# Altium integrated library Supernova Connectors.IntLib: 270 symbols (part 1 of 2) (continued)
## M80-4001442 (continued)

## M80-4131498
designator J?
Housing M80 14POS Screw-lock; Value: 14 Power Pins; Package / Case: THT, RA; Operating Temperature: -55°C ~ 85°C; Supplier 1: Mouser; Supplier 2: Digi-Key; Supplier Part Number 1: 855-M80-4131498; Supplier Part Number 2: 952-3702-ND
pins: 1, 2, 3, 4, 5, 6, 7, 8, 9, 10, 11, 12, 13, 14

## M80-4140898
designator J?
Housing M80 8POS Screw-lock; Value: 14 Power Pins; Package / Case: THT, RA; Operating Temperature: -55°C ~ 85°C; Supplier 1: Mouser; Supplier 2: Digi-Key; Supplier Part Number 2: 952-3732-ND; Supplier Part Number 1: 855-M80-4140898
pins: 1, 2, 3, 4, 5 8, 6, 7, 8

## M80-4141698
designator J?
Housing M80 16POS Screw-lock; Value: 14 Power Pins; Package / Case: THT, RA; Operating Temperature: -55°C ~ 85°C; Supplier 1: Digi-Key; Supplier Part Number 1: 952-3736-ND; Supplier 2: Mouser; Supplier Part Number 2: 855-M80-4141698
pins: 1, 2, 3, 4, 5, 6, 7, 8, 9, 10, 11, 12, 13, 14, 15, 16

## M80-5000000M2-02-331-00-000
designator J?
Header M80 2POS Power Screw-lock; Manufacturer: Harwin; System: Connector; Operating Temperature: -55°C ~ 85°C; Supplier 1: Digi-Key; Supplier Part Number 1: 952-2577-ND; Supplier 2: Mouser; Supplier Part Number 2: 855-M805M202331
footprint M80-5000000M2-02-331-00-000
footprint M80-5000000M2-02-331-00-000 - No Silk
footprint M80-5000000M2-02-331-00-000 - No Silk - nuts
footprint M80-5000000M2-02-331-00-000 - nuts
pins: A, B, F1 F, F2 F

## M80-5000000M2-04-331-00-000
designator J?
Header M80 4POS Power Screw-lock; System: Connector; Supplier 1: Mouser; Supplier Part Number 1: 855-M80500000M204331; Supplier 2: Digi-Key; Supplier Part Number 2: 952-1652-ND
footprint M80-5000000M2-04-331-00-000 - no silk
footprint M80-5000000M2-04-331-00-000
footprint M80-5000000M2-04-331-00-000 - no silk - nuts
pins: A, B, C, D, F1 F, F2 F

## M80-5000000M5-02-333-00-000
designator J?
Header M80 2POS Power RA Screw-lock; Manufacturer: Harwin; Manufacturer Part Number: M80-5401442; Value: 14 Power Pins; System: Connector; Package / Case: THT, RA; Operating Temperature: -55°C ~ 85°C; Supplier 1: Digi-Key; Supplier Part Number 1: 952-2578-ND; Supplier 2: Mouser; Supplier Part Number 2: 855-M805000M50233300
footprint M80-5000000M5-02-333-00-000
footprint M80-5000000M5-02-333-00-000 - button screws
pins: 1, 2, F1 F, F2 F

## M80-5000000M5-04-333-00-000
designator J?
Header M80 4POS Power RA Screw-lock; System: Connector; Supplier 1: Digi-Key; Supplier Part Number 1: 952-3955-5-ND; Supplier 2: Mouser; Supplier Part Number 2: 855-M805000000M50433
footprint M80-5000000M5-04-333-00-000
pins: 1, 2, 3, 4, F1 F, F2 F

## M80-5000442
designator J?
Header M80 4POS Vertical Screw-lock no studs; Manufacturer: Harwin; Manufacturer Part Number: M80-5101442; Value: 14 Power Pins; System: Connector; Package / Case: THT, RA; Operating Temperature: -55°C ~ 85°C; Supplier 1: Mouser; Supplier Part Number 1: 855-M80-5100442; Supplier 2: Digi-Key; Supplier Part Number 2: 952-2343-ND
footprint M80-5000442
footprint M80-5000442 - no holes
pins: 1, 2, 3, 4, F

## M80-5000642
designator J?
Header M80 6POS Vertical Screw-lock no studs; Manufacturer: Harwin; Manufacturer Part Number: M80-5101442; Value: 14 Power Pins; System: Connector; Package / Case: THT, RA; Operating Temperature: -55°C ~ 85°C; Supplier 1: Mouser; Supplier Part Number 1: 855-M80-5000642; Supplier 2: Digi-Key; Supplier Part Number 2: 952-1000-5-ND
footprint M80-5000642
footprint M80-5000642 - no holes
pins: 1, 2, 3, 4, 5, 6, F

## M80-5100442
designator J?
Header M80 4POS Vertical Screw-lock; Manufacturer: Harwin; Manufacturer Part Number: M80-5101442; Value: 14 Power Pins; System: Connector; Package / Case: THT, RA; Operating Temperature: -55°C ~ 85°C; Supplier 1: Digi-Key; Supplier Part Number 1: 952-2343-ND; Supplier 2: Mouser; Supplier Part Number 2: 855-M80-5100442
footprint M80-5100442
pins: 1, 2, 3, 4, F

## M80-5100642
designator J?
Header M80 6POS Vertical Screw-lock; Manufacturer: Harwin; Manufacturer Part Number: M80-5101442; Value: 14 Power Pins; System: Connector; Package / Case: THT, RA; Operating Temperature: -55°C ~ 85°C; Supplier 1: Digi-Key; Supplier Part Number 1: 952-3550-ND; Supplier 2: Newark; Supplier Part Number 2: 45AJ6518
footprint M80-5100642
pins: 1, 2, 3, 4, 5, 6, F

## M80-5100842
designator J?
Header M80 8POS Vertical Screw-lock; Manufacturer: Harwin; Manufacturer Part Number: M80-5101442; Value: 14 Power Pins; System: Connector; Package / Case: THT, RA; Operating Temperature: -55°C ~ 85°C; Supplier 1: Digi-Key; Supplier Part Number 1: 952-2341-ND; Supplier 2: Mouser; Supplier Part Number 2: 855-M80-5100842
footprint M80-5100842
pins: 1, 2, 3, 4, 5, 6, 7, 8, F

## M80-5101042
designator J?
Header M80 10POS Vertical Screw-lock; Manufacturer: Harwin; Manufacturer Part Number: M80-5101442; Value: 14 Power Pins; System: Connector; Package / Case: THT, RA; Operating Temperature: -55°C ~ 85°C; Supplier 1: Digi-Key; Supplier 2: Mouser; Supplier 3: Mouser; Supplier 4: Digi-Key; Supplier Part Number 1: 952-1009-5-ND; Supplier Part Number 4: 952-2914-ND; Supplier Part Number 2: 855-M80-5101042; Supplier Part Number 3: 855-M80-5101022
footprint M80-5101042
footprint M80-5101042 - NO SILK
footprint M80-5101042 - NO SILK - NUTS
pins: 1, 2, 3, 4, 5, 6, 7, 8, 9, 10, F

## M80-5101242
designator J?
Header M80 12POS Vertical Screw-lock; Manufacturer: Harwin; Manufacturer Part Number: M80-5101442; Value: 14 Power Pins; System: Connector; Package / Case: THT, RA; Operating Temperature: -55°C ~ 85°C; Supplier 1: Digi-Key; Supplier Part Number 1: 952-2580-ND; Supplier 2: Mouser; Supplier Part Number 2: 855-M80-5101242
footprint M80-5101242
pins: 1, 2, 3, 4, 5, 6, 7, 8, 9, 10, 11, 12, F

## M80-5101442
designator J?
Header M80 14POS Vertical Screw-lock; Manufacturer: Harwin; Value: 14 Power Pins; System: Connector; Mass_g: 2.198; Manufacturer Part Number: M80-5101442; Package / Case: THT, RA; Operating Temperature: -55°C ~ 85°C; Supplier 1: Digi-Key; Supplier Part Number 1: 952-1010-5-ND; Supplier 2: Mouser; Supplier 3: Newark; Supplier 4: Mouser; Supplier Part Number 2: 855-M80-5101442; Supplier Part Number 3: 92K7305; Supplier Part Number 4: 855-M80-5101405
footprint M80-5101442
pins: 1, 2, 3, 4, 5, 6, 7, 8, 9, 10, 11, 12, 13, 14, F

## M80-5400442
designator J?
Header M80 4POS RA Screw-lock; Manufacturer: Harwin; Manufacturer Part Number: M80-5401442; Value: 8 Power Pins; System: Connector; Package / Case: THT, RA; Operating Temperature: -55°C ~ 85°C; Supplier 1: Digi-Key; Supplier Part Number 1: 952-2583-ND; Supplier 2: Mouser; Supplier Part Number 2: 855-M80-5400442
footprint M80-5400442 (4 pin Datamate connector Male Horizontal PC Tail)
pins: 1, 2, 3, 4, F

## M80-5400842
designator J?
Header M80 8POS RA Screw-lock; Manufacturer: Harwin; Manufacturer Part Number: M80-5401442; Value: 8 Power Pins; System: Connector; Package / Case: THT, RA; Operating Temperature: -55°C ~ 85°C; Supplier 1: Digi-Key; Supplier Part Number 1: 952-2584-ND; Supplier 2: Mouser; Supplier 3: Mouser; Supplier Part Number 2: 855-M80-5400842; Supplier Part Number 3: 855-M80-5400805
footprint M80-5400842 (8 pin Datamate connector Male Horizontal PC Tail)
pins: 1, 2, 3, 4, 5, 6, 7, 8, F

## M80-5401442
designator J?
Header M80 14POS RA Screw-lock; Manufacturer: Harwin; Value: 14 Power Pins; System: Connector; Mass_g: 2.198; Manufacturer Part Number: M80-5401442; Supplier 1: Digi-Key; Supplier Part Number 1: 952-1026-5-ND; Package / Case: THT, RA; Operating Temperature: -55°C ~ 85°C; Supplier 2: Mouser; Supplier 3: Newark; Supplier Part Number 2: 855-M80-5401442; Supplier Part Number 3: 92K7321
footprint M80-5401442 (14 pin Datamate connector Male Horizontal PC Tail)
footprint M80-5401442 - button screws (14 pin Datamate connector Male Horizontal PC Tail)
pins: 1, 2, 3, 4, 5, 6, 7, 8, 9, 10, 11, 12, 13, 14, F

## M80-5401642
designator J?
Header M80 16POS RA Screw-lock; Manufacturer: Harwin; Manufacturer Part Number: M80-5401442; Value: 14 Power Pins; System: Connector; Package / Case: THT, RA; Operating Temperature: -55°C ~ 85°C; Supplier 1: Mouser; Supplier 2: Digi-Key; Supplier Part Number 1: 855-M80-5401642; Supplier Part Number 2: M80-5401642-ND
footprint M80-5401642 (16 pin Datamate connector Male Horizontal PC Tail)
pins: 1, 2, 3, 4, 5, 6, 7, 8, 9, 10, 11, 12, 13, 14, 15, 16, F

## M80-5402042
designator J?
Header M80 20POS RA Screw-lock; Manufacturer: Harwin; Manufacturer Part Number: M80-5401442; Value: 20 Power Pins; System: Connector; Mass_g: 2.467; Package / Case: THT, RA; Operating Temperature: -55°C ~ 85°C; Supplier 1: Digi-Key; Supplier Part Number 1: 952-1027-5-ND; Supplier 2: Newark; Supplier Part Number 2: 92K7322; Supplier 3: Mouser; Supplier Part Number 3: 855-M80-5402005
footprint M80-5402042 (16 pin Datamate connector Male Horizontal PC Tail)
footprint M80-5402042 - BUTTON SCREWS (20 pin Datamate connector Male Horizontal PC Tail)
pins: 1, 2, 3, 4, 5, 6, 7, 8, 9, 10, 11, 12, 13, 14, 15, 16, 17, 18, 19, 20, F

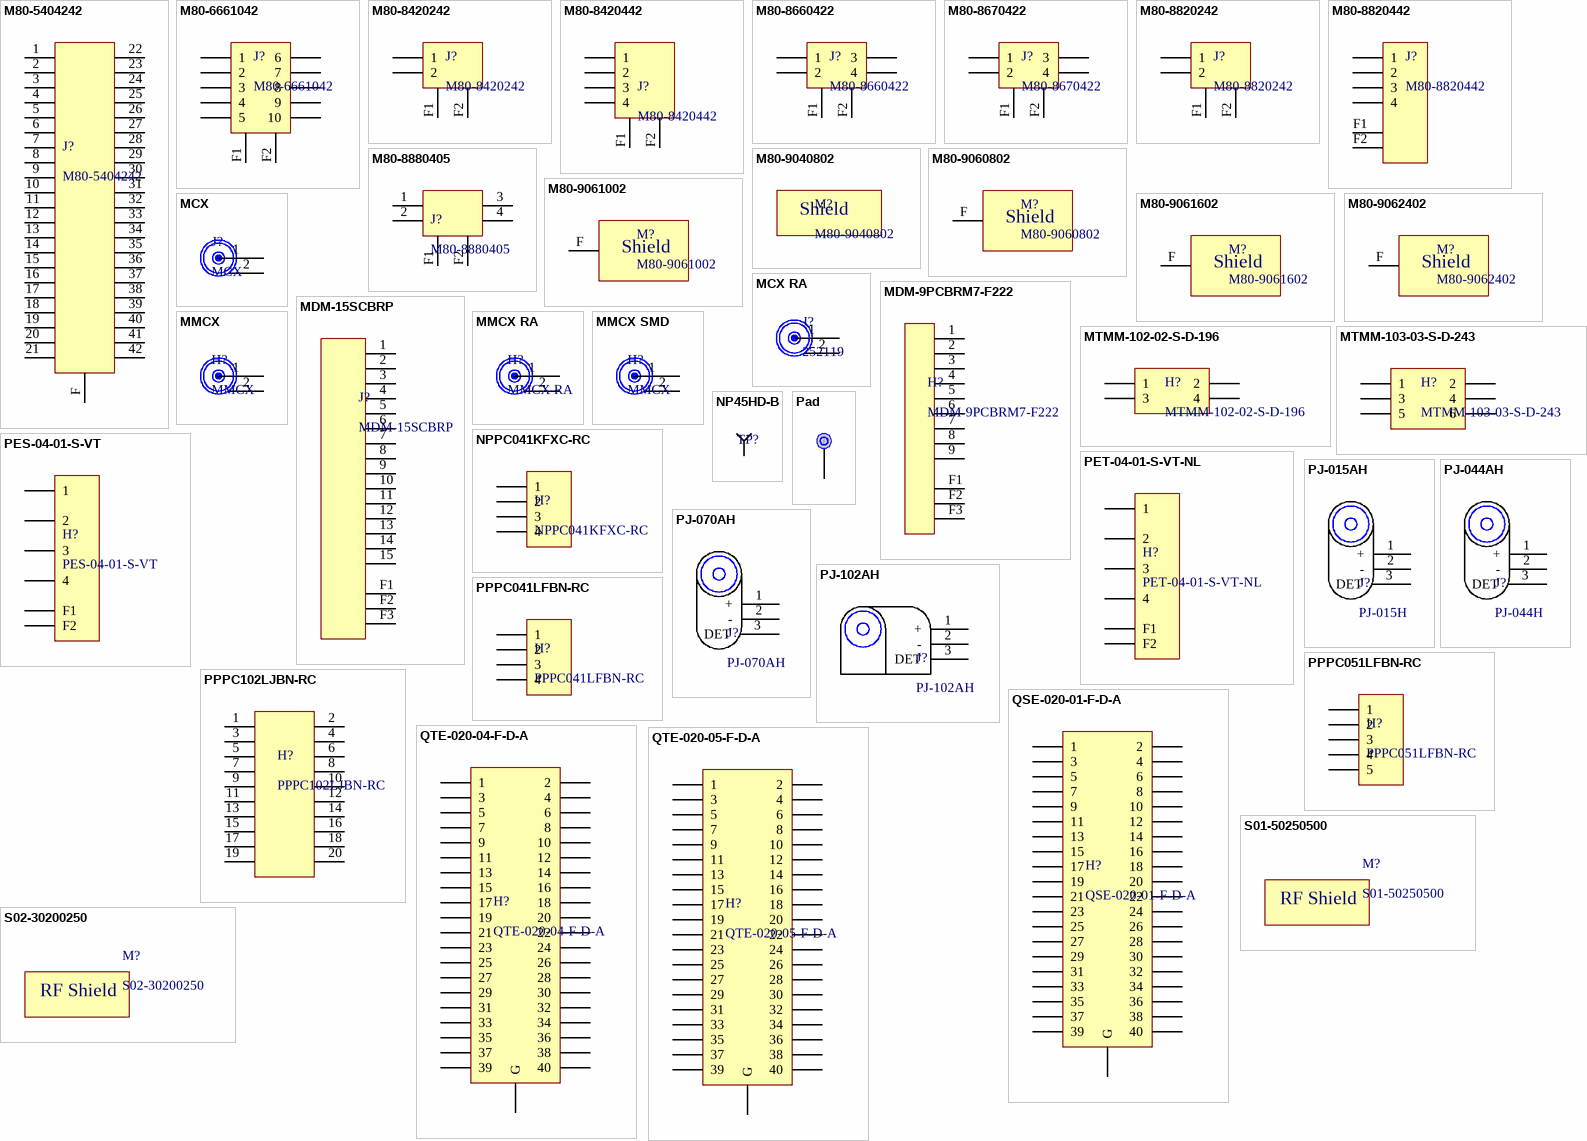
[diagram p6: symbols M80-5404242 to S02-30200250]

## M80-5404242
designator J?
Header M80 42POS RA Screw-lock; Manufacturer: Harwin; Manufacturer Part Number: M80-5401442; Value: 20 Power Pins; System: Connector; Mass_g: 2.467; Package / Case: THT, RA; Operating Temperature: -55°C ~ 85°C; Supplier 1: Digi-Key; Supplier Part Number 1: 952-1030-5-ND; Supplier 2: Mouser; Supplier Part Number 2: 855-M80-5404242; Supplier 3: Newark; Supplier Part Number 3: 56AC6233
footprint M80-5404242 (42 pin Datamate connector Male Horizontal PC Tail)
pins: 1, 2, 3, 4, 5, 6, 7, 8, 9, 10, 11, 12, 13, 14, 15, 16, 17, 18, 19, 20, 21, 22, 23, 24, 25, 26, 27, 28, 29, 30, 31, 32, 33, 34, 35, 36, 37, 38, 39, 40, 41, 42, F

## M80-6661042
designator J?
Header M80 10POS RA Latch-lock; System: Connector; Supplier 1: Digi-Key; Supplier Part Number 1: 952-2098-ND; Supplier 2: Newark; Supplier Part Number 2: 74M3474; Supplier 3: Mouser; Supplier Part Number 3: 855-M80-6661042
footprint M80-6661042
pins: 1, 2, 3, 4, 5, 6, 7, 8, 9, 10, F1 F, F2 F

## M80-8420242
designator J?
Header M80 2POS RA Latch-lock; System: Connector; Supplier 1: Digi-Key; Supplier Part Number 1: 952-1076-5-ND; Supplier 2: Mouser; Supplier Part Number 2: 855-M80-8420242
footprint M80-8420242
pins: 1, 2, F1 F, F2 F

## M80-8420442
designator J?
Header M80 4POS RA Latch-lock; System: Connector; Supplier 1: Digi-Key; Supplier Part Number 1: 952-1078-5-ND; Supplier 2: Mouser; Supplier Part Number 2: 855-M80-8420442
footprint M80-8420442
pins: 1, 2, 3, 4, F1 F, F2 F

## M80-8660422
designator J?
Header M80 4POS RA Latch-lock; System: Connector; Supplier 1: Digi-Key; Supplier Part Number 1: 952-2588-ND; Supplier 2: Newark; Supplier 3: Mouser; Supplier Part Number 2: 01E9547; Supplier Part Number 3: 855-M80-8660422
footprint M80-8660422
pins: 1, 2, 3, 4, F1 F, F2 F

## M80-8670422
designator J?
Header M80 4POS Veritcal Latch-lock; System: Connector; Supplier 1: Digi-Key; Supplier Part Number 1: 952-2414-5-ND; Supplier 2: Newark; Supplier 3: Mouser; Supplier 4: Newark; Supplier Part Number 2: 01E9554; Supplier Part Number 3: 855-M80-8670422; Supplier Part Number 4: 97W2387
footprint M80-8670422
pins: 1, 2, 3, 4, F1 F, F2 F

## M80-8820242
designator J?
Header M80 2POS Latch-lock; System: Connector; Supplier 1: Digi-Key; Supplier Part Number 1: 952-1069-5-ND; Supplier 2: Mouser; Supplier Part Number 2: 855-M80-8820242
footprint M80-8820242
pins: 1, 2, F1 F, F2 F

## M80-8820442
designator J?
Header M80 4POS Veritcal Single Row Latch-lock; System: Connector; Supplier 1: Digi-Key; Supplier Part Number 1: 952-1071-5-ND; Supplier 2: Mouser; Supplier 3: Newark; Supplier 4: Newark; Supplier Part Number 2: 855-M80-8820442; Supplier Part Number 3: 63K4385; Supplier Part Number 4: 75Y6432
footprint M80-8820442
pins: 1, 2, 3, 4, F1 F, F2 F

## M80-8880405
designator J?
Housing M80 4POS Latch-lock; Value: 14 Power Pins; Package / Case: THT, RA; Operating Temperature: -55°C ~ 85°C; Supplier 1: Mouser; Supplier 2: Digi-Key; Supplier Part Number 1: 855-M80-8880405; Supplier Part Number 2: 952-1196-ND
pins: 1, 2, 3, 4, F1 F, F2 F

## M80-9040802
designator M?
M80 Shield 8 pin RA; Supplier 1: Digi-Key; Supplier Part Number 1: 952-4159-ND; Supplier 2: Mouser; Supplier Part Number 2: 855-M80-9060802
footprint M80-9040802
footprint M80-9040802 - No Holes
text: Shield

## M80-9060802
designator M?
M80 Shield 8 pin; Supplier 1: Digi-Key; Supplier Part Number 1: 952-4159-ND; Supplier 2: Mouser; Supplier Part Number 2: 855-M80-9060802
footprint M80-9060802
pins: F 38
text: Shield

## M80-9061002
designator M?
M80 Shield 10 pin; Supplier 1: Mouser; Supplier Part Number 1: 855-M80-9061002; Supplier 2: Digi-Key; Supplier Part Number 2: 952-4140-ND
footprint M80-9061002
pins: F 38
text: Shield

## M80-9061602
designator M?
M80 Shield 16 pin; Supplier 1: Mouser; Supplier Part Number 1: 855-M80-9061602; Supplier 2: Digi-Key; Supplier Part Number 2: 952-4161-ND
footprint m80-9061602
pins: F 38
text: Shield

## M80-9062402
designator M?
M80 Shield 24 pin; Supplier 1: Mouser; Supplier Part Number 1: 855-M80-9062402; Supplier 2: Digi-Key; Supplier Part Number 2: 952-4162-ND
footprint m80-9062402
pins: F 38
text: Shield

## MCX
designator J?
Header MCX Through-hole vertical; Supplier 1: Digi-Key; Supplier Part Number 1: SAM8944-ND; Supplier 2: Newark; Supplier 3: Digi-Key; Supplier Part Number 2: 56AC6098; Supplier Part Number 3: J539-ND
footprint MCX
pins: 1 7, 2 7

## MCX RA
designator J?, comment 252119
Connector MCX RA; Supplier 1: Digi-Key; Supplier 2: Mouser; Supplier Part Number 1: ACX1260-ND; Supplier Part Number 2: 523-252119
pins: 1 7, 2 7

## MDM-9PCBRM7-F222
designator H?
Header microD 9 pin; System: Connector; Supplier 1: Newark; Supplier Part Number 1: 73H6073; Supplier 2: Digi-Key; Supplier Part Number 2: IMDM-9PCBRM7-F222-ND
footprint microD 9
pins: 1 0, 2 0, 3 0, 4 0, 5 0, 6 0, 7 0, 8 0, 9 0, F1 F, F2 F, F3 F

## MDM-15SCBRP
designator J?
Header microD 15 pin; System: Connector; Supplier 1: Digi-Key; Supplier 2: Newark; Supplier Part Number 1: 1003-1282-ND; Supplier Part Number 2: 20M4865
footprint microD 15
pins: 1 0, 2 0, 3 0, 4 0, 5 0, 6 0, 7 0, 8 0, 9 0, 10 1, 11 2, 12 3, 13 4, 14 5, 15 6, F1 F, F2 F, F3 F

## MMCX
designator H?
Header MMCX Through-hole vertical; Mass_g: 0.26; Supplier 1: Digi-Key; Supplier Part Number 1: WM9481-ND; Supplier 2: Digi-Key; Supplier 3: Digi-Key; Supplier Part Number 2: WM5557-ND; Supplier Part Number 3: SAM10617-ND
footprint mmcx
pins: 1 7, 2 7

## MMCX RA
designator H?
Header MMCX Through-hole Right angle; Supplier 1: Digi-Key; Supplier Part Number 1: SAM10615-ND; Supplier 2: Digi-Key; Supplier Part Number 2: J599-ND; Supplier 3: Digi-Key; Supplier Part Number 3: WM5552-ND
footprint mmcx-RA
pins: 1 7, 2 7

## MMCX SMD
designator H?, comment MMCX
Header MMCX SMD vertical; Supplier 1: Digi-Key; Supplier Part Number 1: 732-14187-1-ND; Supplier 2: Digi-Key; Supplier Part Number 2: J10059CT-ND
footprint mmcx - SMD
pins: 1 7, 2 7

## MTMM-102-02-S-D-196
designator H?
Header 2x2 TH thru-board 2mm; System: Connector; Supplier 1: Digi-Key; Supplier 2: Digi-Key; Supplier Part Number 2: MTMM-102-02-G-D-196-ND; Supplier Part Number 1: MTMM-102-02-S-D-196-ND
footprint MTMM-102-02-S-D-196
pins: 1, 2, 3, 4

## MTMM-103-03-S-D-243
designator H?
Header 3x2 TH thru-board 2mm; System: Connector; Supplier 1: Digi-Key; Supplier Part Number 1: MTMM-103-03-G-D-243-ND; Supplier 2: Digi-Key; Supplier Part Number 2: MTMM-103-03-G-D-000-ND
footprint MTMM-103-03-S-D-243
pins: 1, 2, 3, 4, 5, 6

## NP45HD-B
designator TP?, comment Spring Contact  (value not drawn)  (no BOM)
footprint NP45HD-B
pins: 1

## NPPC041KFXC-RC
designator H?
Header 4x1 SMT; System: Connector; Supplier 1: Digi-Key; Supplier Part Number 1: S5635-ND; Supplier 2: Digi-Key; Supplier 3: Digi-Key; Supplier Part Number 2: SAM1148-04-ND; Supplier Part Number 3: SAM1152-04-ND
footprint 4 Pin Header SMT Vert
pins: 1, 2, 3, 4

## Pad
designator TP?  (value not drawn)  (no BOM)
Testpoint Pad
footprint Pad
footprint TH PAD
pins: 1

## PES-04-01-S-VT
designator H?
Header 4 Pin PES; System: Connector; Supplier 1: Digi-Key; Supplier Part Number 1: SAM12737-ND
footprint PES-04-01-S-VT
pins: 1, 2, 3, 4, F1, F2

## PET-04-01-S-VT-NL
designator H?
Header 4 Pin PET; System: Connector; Supplier 1: Digi-Key; Supplier 2: Digi-Key; Supplier Part Number 1: SAM16022-ND; Supplier Part Number 2: SAM11555-ND
footprint PET-04-01-S-VT-NL
pins: 1, 2, 3, 4, F1, F2

## PJ-015AH
designator J?, comment PJ-015H
Header Barrel Vertical SMT; Supplier 1: Digi-Key; Supplier Part Number 1: CP-015AHPJ-CT-ND; Supplier 2: Mouser; Supplier Part Number 2: 490-PJ-015AH-SMT-TR
footprint PJ-015AH
pins: 1 +, 2 -, 3 DET

## PJ-044AH
designator J?, comment PJ-044H
Header Barrel Veritcal TH; Supplier 1: Digi-Key; Supplier Part Number 1: CP-044AH-ND; Supplier 2: Mouser; Supplier Part Number 2: 490-PJ-044AH
footprint PJ-044AH
pins: 1 +, 2 -, 3 DET

## PJ-070AH
designator J?
Header Barrel Vertical SMT; Supplier 1: Digi-Key; Supplier Part Number 1: CP-070AHPJDKR-ND; Supplier 2: Mouser; Supplier Part Number 2: 490-PJ-070AH-SMT-TR
footprint PJ-070BH
pins: 1 +, 2 -, 3 DET

## PJ-102AH
designator J?
Header Barrel RA TH; Supplier 1: Digi-Key; Supplier Part Number 1: CP-102AH-ND; Supplier 2: Mouser; Supplier Part Number 2: 490-PJ-102AH
footprint PJ-102AH
pins: 1 +, 2 -, 3 DET

## PPPC041LFBN-RC
designator H?
Header 4x1 TH; System: Connector; Supplier 1: Digi-Key; Supplier Part Number 1: S7037-ND; Supplier 2: Digi-Key; Supplier Part Number 2: 952-1791-ND
footprint 4 pin TH header Vert
pins: 1, 2, 3, 4

## PPPC051LFBN-RC
designator H?
Header 5x1 TH; System: Connector; Supplier 1: Digi-Key; Supplier Part Number 1: S7038-ND; Supplier 2: Digi-Key; Supplier Part Number 2: 952-1801-ND
footprint 5 pin TH header Vert
pins: 1, 2, 3, 4, 5

## PPPC102LJBN-RC
designator H?
Header 10x2 TH RA; System: Connector; Supplier 1: Digi-Key; Supplier 2: Digi-Key; Supplier Part Number 1: S5563-ND; Supplier Part Number 2: S9205-ND
footprint PPPC102LJBN-RC
pins: 1, 2, 3, 4, 5, 6, 7, 8, 9, 10, 11 1, 12, 13, 14, 15, 16, 17, 18, 19, 20

## QSE-020-01-F-D-A
designator H?
Header 40 Pin QSE; System: Connector; Supplier 1: Digi-Key; Supplier 2: Digi-Key; Supplier Part Number 1: SAM8123-ND; Supplier Part Number 2: SAM8955-ND
footprint QSE-020-01-F-D-A
pins: 1, 2, 3, 4, 5, 6, 7, 8, 9, 10, 11, 12, 13, 14, 15, 16, 17, 18, 19, 20, 21, 22, 23, 24, 25, 26, 27, 28, 29, 30, 31, 32, 33, 34, 35, 36, 37, 38, 39, 40, G

## QTE-020-04-F-D-A
designator H?
Header 40 Pin QTE 16mm; System: Connector; Supplier 1: Digi-Key; Supplier Part Number 1: SAM14254CT-ND; Supplier 2: Digi-Key; Supplier Part Number 2: SAM11610-ND; Supplier 3: Digi-Key; Supplier Part Number 3: SAM12778-ND; Supplier 4: Digi-Key; Supplier Part Number 4: 612-QTE-020-04-L-D-A-K-TRCT-ND
footprint QTE-020-04-F-D-A
pins: 1, 2, 3, 4, 5, 6, 7, 8, 9, 10, 11, 12, 13, 14, 15, 16, 17, 18, 19, 20, 21, 22, 23, 24, 25, 26, 27, 28, 29, 30, 31, 32, 33, 34, 35, 36, 37, 38, 39, 40, G

## QTE-020-05-F-D-A
designator H?
Header 40 Pin QTE 19mm; System: Connector; Supplier 1: Digi-Key; Supplier Part Number 2: SAM10661-ND; Supplier Part Number 1: SAM9807-ND; Supplier 2: Digi-Key
footprint QTE-020-05-F-D-A
pins: 1, 2, 3, 4, 5, 6, 7, 8, 9, 10, 11, 12, 13, 14, 15, 16, 17, 18, 19, 20, 21, 22, 23, 24, 25, 26, 27, 28, 29, 30, 31, 32, 33, 34, 35, 36, 37, 38, 39, 40, G

## S01-50250500
designator M?
EMI Shield; Supplier 1: Digi-Key; Supplier Part Number 1: 952-2642-ND; Supplier 2: Mouser; Supplier Part Number 2: 855-S01-50250500
footprint S01-50250500 (RF Shield)
text: RF Shield

## S02-30200250
designator M?
EMI Shield; Supplier 1: Digi-Key; Supplier 2: Mouser; Supplier Part Number 1: 952-2634-ND; Supplier Part Number 2: 855-S02-30200250
footprint S02-30200250 (RF Shield)
text: RF Shield

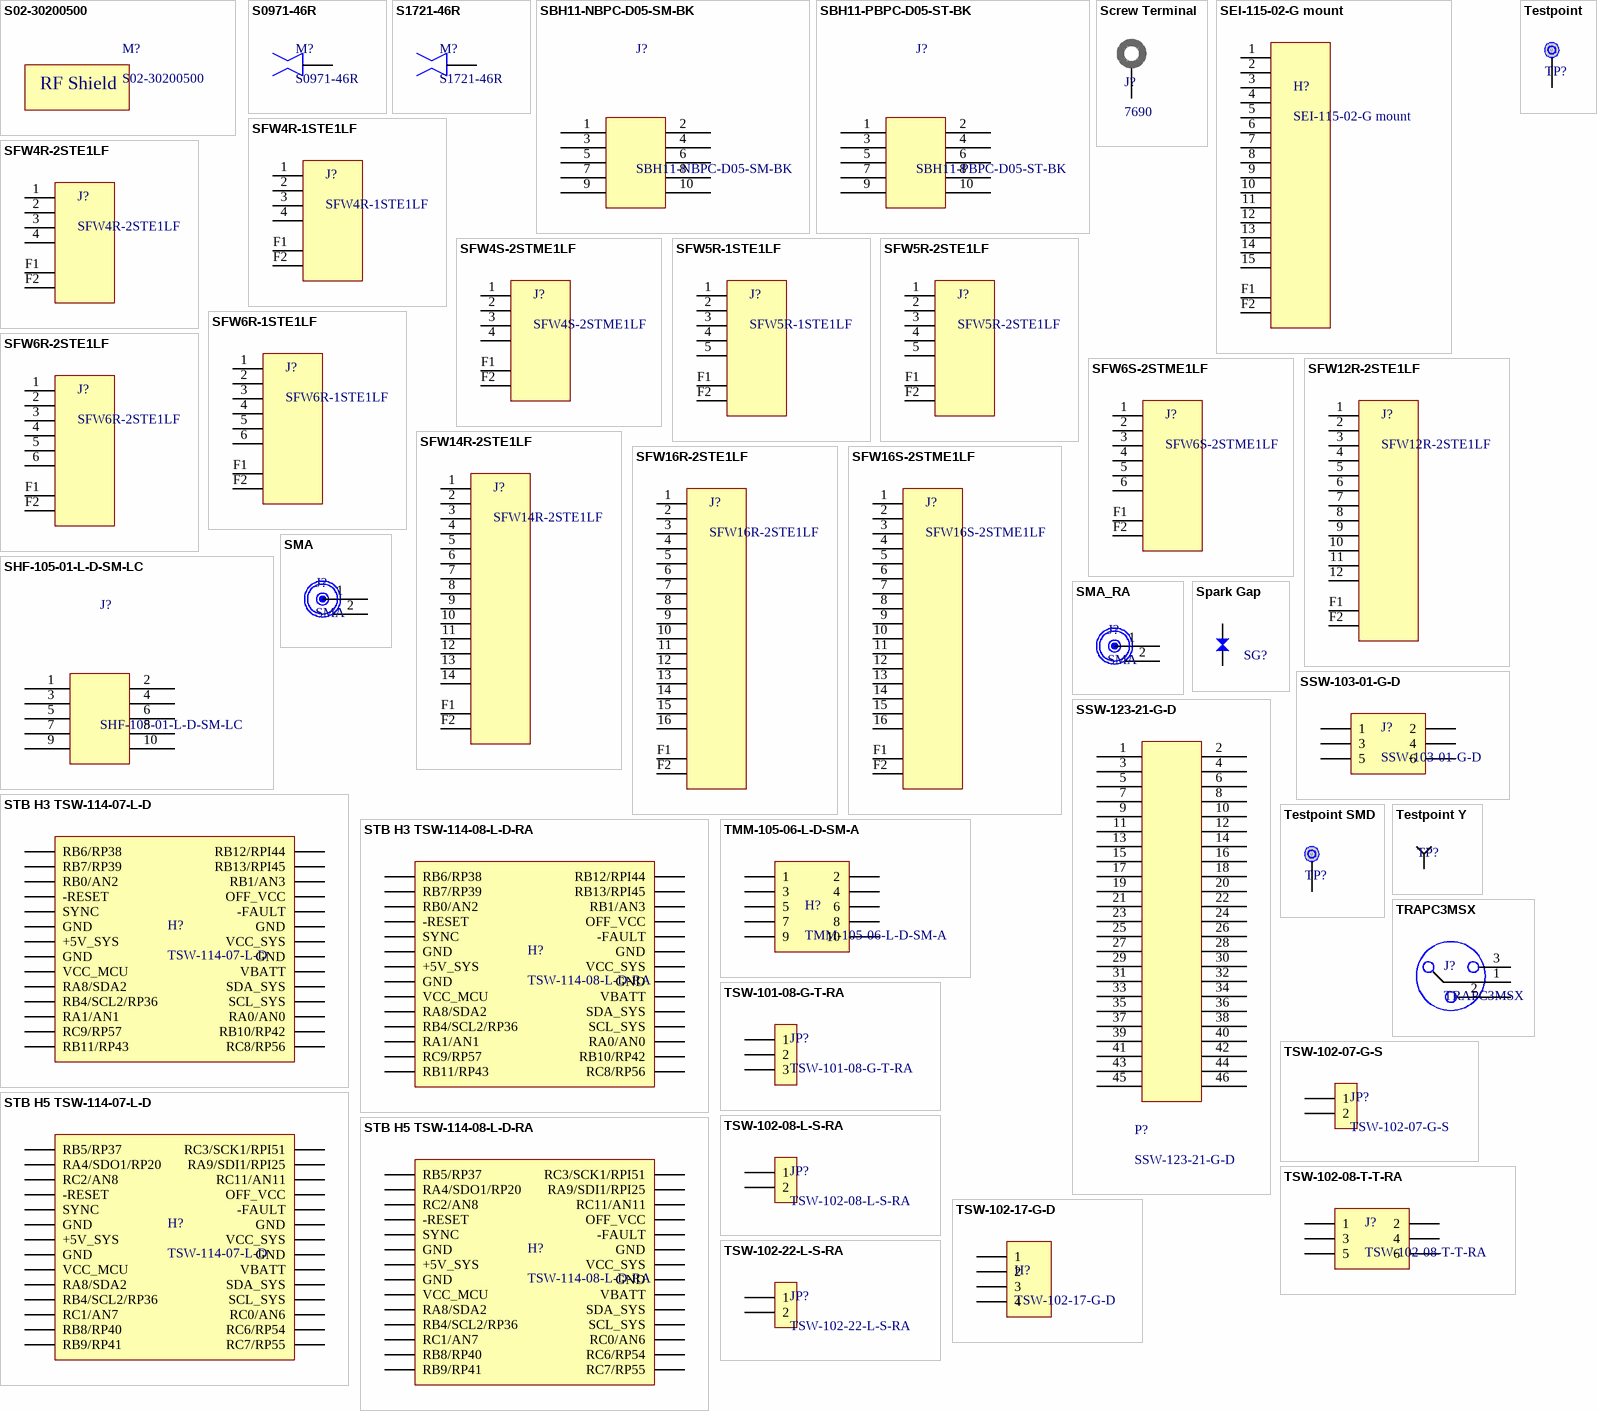
[diagram p7: symbols S02-30200500 to TSW-102-22-L-S-RA]

## S02-30200500
designator M?
EMI Shield; Supplier 1: Digi-Key; Supplier 2: Mouser; Supplier Part Number 1: 952-2640-ND; Supplier Part Number 2: 855-S01-30200500
footprint S02-30200500 (RF Shield)
text: RF Shield

## S0971-46R
designator M?
EMI Shield clip; Supplier 1: Digi-Key; Supplier Part Number 1: 952-2517-1-ND; Supplier 2: Mouser; Supplier Part Number 2: 855-S0971-46R
footprint S0971-46R (EMI Shield Clip)
pins: 1 26

## S1721-46R
designator M?
EMI Shield clip; Supplier 1: Digi-Key; Supplier 2: Mouser; Supplier Part Number 1: 952-1476-1-ND; Supplier Part Number 2: 855-S1721-46R
footprint S1721-46R (EMI Shield Clip)
pins: 1 26

## SBH11-NBPC-D05-SM-BK
designator J?
Header 10 pin Box SMD; System: Connector; Supplier 1: Digi-Key; Supplier Part Number 1: S9185-ND; Supplier 2: Digi-Key; Supplier Part Number 2: AE11081-ND
footprint SBH11-NBPC-D05-SM-BK
pins: 1, 2, 3, 4, 5, 6, 7, 8, 9, 10

## SBH11-PBPC-D05-ST-BK
designator J?
Header 10 pin Box; System: Connector; Supplier 1: Digi-Key; Supplier Part Number 1: S9169-ND; Supplier 2: Digi-Key; Supplier Part Number 2: ED1543-ND
footprint 2x5 Shrouded Box
pins: 1, 2, 3, 4, 5, 6, 7, 8, 9, 10

## Screw Terminal
designator J?, comment 7690
Screw terminal 6-32; Supplier 1: Mouser; Supplier 2: Digi-Key; Supplier Part Number 1: 534-7690; Supplier Part Number 2: 36-7690-ND
footprint Screw terminal 6-32
pins: 1

## SEI-115-02-G mount
designator H?  (no BOM)
Header 15 pin compression; System: Connector
footprint SEI-115-02-MTI_MATE_FP
pins: 1, 2, 3, 4, 5, 6, 7, 8, 9, 10, 11, 12, 13, 14, 15, F1 F, F2 F

## SFW4R-1STE1LF
designator J?
Header Flex Connector 4 pin; bottom side; Supplier 1: Digi-Key; Supplier Part Number 1: 609-1883-1-ND; Supplier 2: Mouser; Supplier Part Number 2: 649-SFW4R-1STE1LF; System: Connector
footprint SFW4R-1STE1LF
pins: 1, 2 1, 3 1, 4 1, F1 F, F2 F

## SFW4R-2STE1LF
designator J?
Header Flex Connector 4 pin; top side; Supplier 1: Digi-Key; Supplier Part Number 1: 609-1884-1-ND; Supplier 2: Mouser; Supplier Part Number 2: 649-SFW4R-2STE1LF; System: Connector
footprint SFW4R-2STE1LF
pins: 1, 2 1, 3 1, 4 1, F1 F, F2 F

## SFW4S-2STME1LF
designator J?
Header Flex Connector 4 pin; top side; Supplier 1: Digi-Key; Supplier Part Number 1: 609-1133-1-ND; Supplier 2: Mouser; Supplier 3: Newark; Supplier Part Number 2: 649-SFW4S-2STME1LF; Supplier Part Number 3: 06M0312; Supplier 4: Digi-Key; Supplier Part Number 4: 609-1132-1-ND; System: Connector
footprint SFW4S-2ST(M)E1LF
pins: 1, 2 1, 3 1, 4 1, F1 F, F2 F

## SFW5R-1STE1LF
designator J?
Header Flex Connector 5 pin; bottom side; Supplier 1: Mouser; Supplier 2: Digi-Key; Supplier Part Number 1: 649-SFW5R-1STE1LF; Supplier Part Number 2: 609-1887-1-ND; System: Connector
footprint SFW5R-1STE1LF
pins: 1, 2 1, 3 1, 4 1, 5 1, F1 F, F2 F

## SFW5R-2STE1LF
designator J?
Header Flex Connector 5 pin; top side; Supplier 1: Digi-Key; Supplier 2: Mouser; Supplier Part Number 2: 649-SFW5R-2STE1LF; Supplier Part Number 1: 609-1888-1-ND; System: Connector
footprint SFW5R-2STE1LF
pins: 1, 2 1, 3 1, 4 1, 5 1, F1 F, F2 F

## SFW6R-1STE1LF
designator J?
Header Flex Connector 6 pin; bottom side; Supplier 1: Digi-Key; Supplier Part Number 1: 609-1889-1-ND; Supplier 2: Mouser; Supplier Part Number 2: 649-SFW6R-1STE1LF; System: Connector
footprint SFW6R-1STE1LF
pins: 1, 2 1, 3 1, 4 1, 5 1, 6 1, F1 F, F2 F

## SFW6R-2STE1LF
designator J?
Header Flex Connector 6 pin; top side; Supplier 1: Digi-Key; Supplier Part Number 1: 609-1890-1-ND; Supplier 2: Mouser; Supplier Part Number 2: 649-SFW6R-2STE1LF; System: Connector
footprint SFW6R-2STE1LF
pins: 1, 2 1, 3 1, 4 1, 5 1, 6 1, F1 F, F2 F